# Altium footprint library ICs And Semiconductors SMD.PcbLib: 943 footprints (part 42 of 60)
Each footprint in its own frame and in the unit in brackets; x right, y up, seen from the top. Pads: shape width x height; smd on the part's side, far side on the other; paste and mask are expansions set on the pad; w line width, h text height; cw(c..) or ccw(c..) is an arc to the next point about the centre after c.
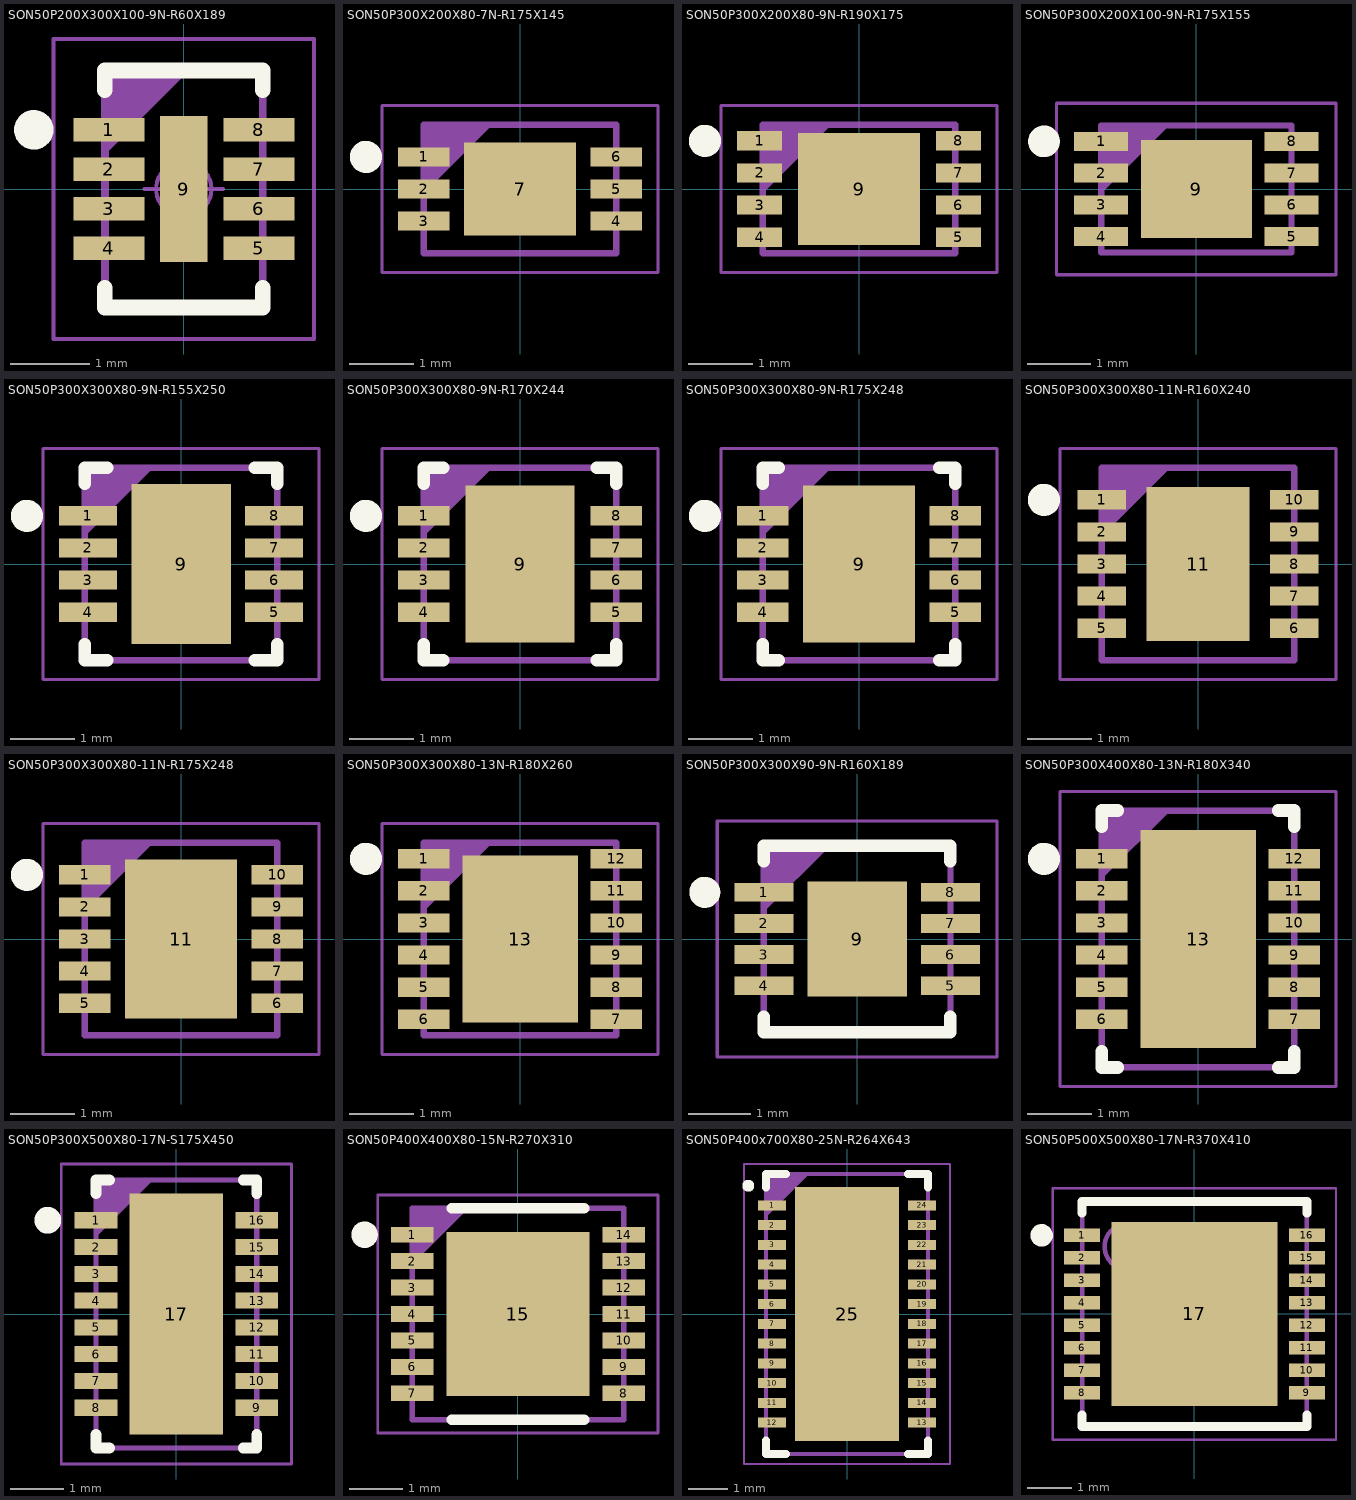
[diagram p41: the footprints below, top view; thin cyan lines are the x and y axes]

## SON50P200X300X100-9N-R60X189 [mm] "SON (DFN), 0.50mm pitch, 8 pin, 2mm X 3mm X 1mm H body (w/thermal tab 0.6 X 1.89mm),  IPC Medium Density"
height 1
pads (9):
  rect 0.9x0.3 smd: 1(-0.95,0.75) 2(-0.95,0.25) 3(-0.95,-0.25) 4(-0.95,-0.75) 5(0.95,-0.75) 6(0.95,-0.25) 7(0.95,0.25) 8(0.95,0.75)
  rect 0.6x1.85 smd paste-0.155: 9(0,0)
Top Overlay:
  circle w0.25: c-1.9,0.75 r0.125
  lines w0.2: -1,-1.25 -1,-1.5 1,-1.5 1,-1.25 ; -1,1.25 -1,1.5 1,1.5 1,1.25
Mechanical 14:
  lines w0.1: -1,0.5 0,1.5 ; -1,0.6 -0.1,1.5 ; -1,0.7 -0.2,1.5 ; -1,0.8 -0.3,1.5 ; -1,0.9 -0.4,1.5 ; -1,1 -0.5,1.5 ; -1,1.1 -0.6,1.5 ; -1,1.2 -0.7,1.5 ; -1,1.3 -0.8,1.5 ; -1,1.4 -0.9,1.5 ; -1,-1.5 -1,1.5 1,1.5 1,-1.5 -1,-1.5
Mechanical 15:
  circle w0.05: c0,0 r0.35
  lines w0.05: -0.5,0 0.5,0 ; 0,-0.5 0,0.5 ; -1.65,-1.9 -1.65,1.9 1.65,1.9 1.65,-1.9 -1.65,-1.9
3D body "SON50P200X300X100-9N-R60X189.stp": height 1, standoff 0, extent -1,-1.5 1,1.5

## SON50P300X200X80-7N-R175X145 [mm] "SON (DFN), 0.50mm pitch, 6 pin, 3mm X 2mm X 0.8mm H body (w/thermal tab 1.75 X 1.45mm),  IPC Medium Density"
height 0.8
pads (7):
  rect 0.8x0.3 smd: 1(-1.5,0.5) 2(-1.5,0) 3(-1.5,-0.5) 4(1.5,-0.5) 5(1.5,0) 6(1.5,0.5)
  rect 1.75x1.45 smd: 7(0,0)
Top Overlay:
  circle w0.25: c-2.4,0.5 r0.125
Mechanical 14:
  lines w0.1: -1.5,0 -0.5,1 ; -1.5,0.1 -0.6,1 ; -1.5,0.2 -0.7,1 ; -1.5,0.3 -0.8,1 ; -1.5,0.4 -0.9,1 ; -1.5,0.5 -1,1 ; -1.5,0.6 -1.1,1 ; -1.5,0.7 -1.2,1 ; -1.5,0.8 -1.3,1 ; -1.5,0.9 -1.4,1 ; -1.5,-1 1.5,-1 1.5,1 -1.5,1 -1.5,-1
Mechanical 15:
  circle w0.05: c0,0 r0.35
  lines w0.05: -0.5,0 0.5,0 ; 0,-0.5 0,0.5 ; -2.15,-1.3 2.15,-1.3 2.15,1.3 -2.15,1.3 -2.15,-1.3
3D body "SON50P300X200X80-7N-R175X145.stp": height 0.85, standoff 0, extent -1.55,-1.05 1.55,1.05

## SON50P300X200X80-9N-R190X175 [mm] "SON (DFN), 0.50mm pitch, 8 pin, 2mm X 3mm X 0.8mm H body (w/thermal tab 1.90 X 1.75mm),  IPC Medium Density"
height 0.8
pads (9):
  rect 0.7x0.3 smd: 1(-1.55,0.75) 2(-1.55,0.25) 3(-1.55,-0.25) 4(-1.55,-0.75) 5(1.55,-0.75) 6(1.55,-0.25) 7(1.55,0.25) 8(1.55,0.75)
  rect 1.9x1.75 smd: 9(0,0)
Top Overlay:
  circle w0.25: c-2.4,0.75 r0.125
Top Solder:
  circle w0.05: c0,0 r0.35
  lines w0.05: -0.5,0 0.5,0 ; 0,-0.5 0,0.5
Mechanical 14:
  lines w0.1: -1.5,0 -0.5,1 ; -1.5,0.1 -0.6,1 ; -1.5,0.2 -0.7,1 ; -1.5,0.3 -0.8,1 ; -1.5,0.4 -0.9,1 ; -1.5,0.5 -1,1 ; -1.5,0.6 -1.1,1 ; -1.5,0.7 -1.2,1 ; -1.5,0.8 -1.3,1 ; -1.5,0.9 -1.4,1 ; -1.5,-1 -1.5,1 1.5,1 1.5,-1 -1.5,-1
Mechanical 15:
  lines w0.05: -2.15,-1.3 -2.15,1.3 2.15,1.3 2.15,-1.3 -2.15,-1.3
3D body "SON50P300X200X80-9N-R190X175.stp": height 0.82, standoff 0, extent -1.5,-1 1.5,1

## SON50P300X200X100-9N-R175X155 [mm] "SON (DFN), 0.50mm pitch, 8 pin, 2mm X 3mm X 1.00mm H body (w/thermal tab 1.75 X 1.55mm),  IPC Medium Density"
height 1
pads (9):
  rect 0.85x0.3 smd: 1(-1.5,0.75) 2(-1.5,0.25) 3(-1.5,-0.25) 4(-1.5,-0.75) 5(1.5,-0.75) 6(1.5,-0.25) 7(1.5,0.25) 8(1.5,0.75)
  rect 1.75x1.55 smd: 9(0,0)
Top Overlay:
  circle w0.25: c-2.4,0.75 r0.125
Mechanical 14:
  lines w0.1: -1.5,0 -0.5,1 ; -1.5,0.1 -0.6,1 ; -1.5,0.2 -0.7,1 ; -1.5,0.3 -0.8,1 ; -1.5,0.4 -0.9,1 ; -1.5,0.5 -1,1 ; -1.5,0.6 -1.1,1 ; -1.5,0.7 -1.2,1 ; -1.5,0.8 -1.3,1 ; -1.5,0.9 -1.4,1 ; -1.5,-1 -1.5,1 1.5,1 1.5,-1 -1.5,-1
Mechanical 15:
  lines w0.05: -2.2,-1.35 -2.2,1.35 2.2,1.35 2.2,-1.35 -2.2,-1.35
3D body "SON50P300X200X100-9N-R175X155.stp": height 1.02, standoff 0, extent -1.5,-1 1.5,1

## SON50P300X300X80-9N-R155X250 [mm] "SON,  0.50mm Pitch, 8 Pin, 3mm X 3mm X 0.8mm H Body (w/Thermal Tab 1.55 X 2.5mm),  IPC Medium Density"
height 0.8
pads (9):
  rect 0.9x0.3 smd: 1(-1.45,0.75) 2(-1.45,0.25) 3(-1.45,-0.25) 4(-1.45,-0.75) 5(1.45,-0.75) 6(1.45,-0.25) 7(1.45,0.25) 8(1.45,0.75)
  rect 1.55x2.5 smd paste-0.345: 9(0,0)
Top Overlay:
  circle w0.25: c-2.4,0.75 r0.125
  lines w0.2: -1.5,-1.25 -1.5,-1.5 -1.15,-1.5 ; -1.5,1.25 -1.5,1.5 -1.15,1.5 ; 1.15,-1.5 1.5,-1.5 1.5,-1.25 ; 1.15,1.5 1.5,1.5 1.5,1.25
Mechanical 14:
  lines w0.1: -1.5,0.5 -0.5,1.5 ; -1.5,0.6 -0.6,1.5 ; -1.5,0.7 -0.7,1.5 ; -1.5,0.8 -0.8,1.5 ; -1.5,0.9 -0.9,1.5 ; -1.5,1 -1,1.5 ; -1.5,1.1 -1.1,1.5 ; -1.5,1.2 -1.2,1.5 ; -1.5,1.3 -1.3,1.5 ; -1.5,1.4 -1.4,1.5 ; -1.5,-1.5 1.5,-1.5 1.5,1.5 -1.5,1.5 -1.5,-1.5
Mechanical 15:
  circle w0.05: c0,0 r0.35
  lines w0.05: -0.5,0 0.5,0 ; 0,-0.5 0,0.5 ; -2.15,-1.8 -2.15,1.8 2.15,1.8 2.15,-1.8 -2.15,-1.8
3D body "SON50P300X300X80-9N-R155X250.stp": height 0.8, standoff 0, extent -1.5,-1.5 1.5,1.5

## SON50P300X300X80-9N-R170X244 [mm] "SON, (DFN) 0.50mm,pitch; 8 pin,3.00mm W X 3.00mm L X 0.80mm H body (w/thermal tab 1.7 X2.44mm), IPC Medium Density"
height 0.8
pads (9):
  rect 0.8x0.3 smd: 1(-1.5,0.75) 2(-1.5,0.25) 3(-1.5,-0.25) 4(-1.5,-0.75) 5(1.5,-0.75) 6(1.5,-0.25) 7(1.5,0.25) 8(1.5,0.75)
  rect 1.7x2.44 smd: 9(0,0)
Top Overlay:
  circle w0.25: c-2.4,0.75 r0.125
  lines w0.2: -1.5,-1.25 -1.5,-1.5 -1.2,-1.5 ; -1.5,1.25 -1.5,1.5 -1.2,1.5 ; 1.2,-1.5 1.5,-1.5 1.5,-1.25 ; 1.2,1.5 1.5,1.5 1.5,1.25
Mechanical 14:
  circle w0.05: c0,0 r0.35
  lines w0.05: -0.5,0 0.5,0 ; 0,-0.5 0,0.5
  lines w0.1: -1.5,0.5 -0.5,1.5 ; -1.5,0.6 -0.6,1.5 ; -1.5,0.7 -0.7,1.5 ; -1.5,0.8 -0.8,1.5 ; -1.5,0.9 -0.9,1.5 ; -1.5,1 -1,1.5 ; -1.5,1.1 -1.1,1.5 ; -1.5,1.2 -1.2,1.5 ; -1.5,1.3 -1.3,1.5 ; -1.5,1.4 -1.4,1.5 ; -1.5,-1.5 -1.5,1.5 1.5,1.5 1.5,-1.5 -1.5,-1.5
Mechanical 15:
  lines w0.05: -2.15,-1.8 2.15,-1.8 2.15,1.8 -2.15,1.8 -2.15,-1.8
3D body "SON50P300X300X80-9N-R170X244.stp": height 0.8, standoff 0, extent -1.55,-1.55 1.55,1.55

## SON50P300X300X80-9N-R175X248 [mm] "SON, (DFN) 0.50mm,pitch; 8 pin,3.00mm W X 3.00mm L X 0.80mm H body (w/thermal tab 1.75 X2.48mm), IPC Medium Density"
height 0.8
pads (9):
  rect 0.8x0.3 smd: 1(-1.5,0.75) 2(-1.5,0.25) 3(-1.5,-0.25) 4(-1.5,-0.75) 5(1.5,-0.75) 6(1.5,-0.25) 7(1.5,0.25) 8(1.5,0.75)
  rect 1.75x2.45 smd: 9(0,0)
Top Overlay:
  circle w0.25: c-2.4,0.75 r0.125
  lines w0.2: -1.5,-1.25 -1.5,-1.5 -1.25,-1.5 ; -1.5,1.25 -1.5,1.5 -1.25,1.5 ; 1.25,-1.5 1.5,-1.5 1.5,-1.25 ; 1.25,1.5 1.5,1.5 1.5,1.25
Mechanical 14:
  lines w0.1: -1.5,0.5 -0.5,1.5 ; -1.5,0.6 -0.6,1.5 ; -1.5,0.7 -0.7,1.5 ; -1.5,0.8 -0.8,1.5 ; -1.5,0.9 -0.9,1.5 ; -1.5,1 -1,1.5 ; -1.5,1.1 -1.1,1.5 ; -1.5,1.2 -1.2,1.5 ; -1.5,1.3 -1.3,1.5 ; -1.5,1.4 -1.4,1.5 ; -1.5,-1.5 -1.5,1.5 1.5,1.5 1.5,-1.5 -1.5,-1.5
Mechanical 15:
  lines w0.05: -0.5,0 0.5,0 ; 0,-0.5 0,0.5 ; -2.15,-1.8 2.15,-1.8 2.15,1.8 -2.15,1.8 -2.15,-1.8
3D body "SON50P300X300X80-9N-R175X248.stp": height 0.8, standoff 0, extent -1.55,-1.55 1.55,1.55

## SON50P300X300X80-11N-R160X240 [mm] "SON, 0.50mm Pitch, 10-pin, 3.00mm W  X 3.00mm L X 0.80mm Height, (w/thermal tab 1.60 X 2.40 mm), IPC Medium Density"
height 0.8
pads (11):
  rect 0.75x0.3 smd: 1(-1.5,1) 2(-1.5,0.5) 3(-1.5,0) 4(-1.5,-0.5) 5(-1.5,-1) 6(1.5,-1) 7(1.5,-0.5) 8(1.5,0) 9(1.5,0.5) 10(1.5,1)
  rect 1.6x2.4 smd paste-0.35: 11(0,0)
Top Overlay:
  circle w0.25: c-2.4,1 r0.125
Mechanical 14:
  lines w0.1: -1.5,0.5 -0.5,1.5 ; -1.5,0.6 -0.6,1.5 ; -1.5,0.7 -0.7,1.5 ; -1.5,0.8 -0.8,1.5 ; -1.5,0.9 -0.9,1.5 ; -1.5,1 -1,1.5 ; -1.5,1.1 -1.1,1.5 ; -1.5,1.2 -1.2,1.5 ; -1.5,1.3 -1.3,1.5 ; -1.5,1.4 -1.4,1.5 ; -1.5,-1.5 1.5,-1.5 1.5,1.5 -1.5,1.5 -1.5,-1.5
Mechanical 15:
  circle w0.05: c0,0 r0.35
  lines w0.05: -0.5,0 0.5,0 ; 0,-0.5 0,0.5 ; -2.15,-1.8 -2.15,1.8 2.15,1.8 2.15,-1.8 -2.15,-1.8
3D body "SON50P300X300X80-11N-R160X240.stp": height 0.8, standoff 0, extent -1.5,-1.5 1.5,1.5

## SON50P300X300X80-11N-R175X248 [mm] "SON, 0.50mm Pitch, 10-pin, 3.00mm W  X 3.00mm L X 0.80mm Height, (w/thermal tab 1.75 X 2.48 mm), IPC Medium Density"
height 0.8
pads (11):
  rect 0.8x0.3 smd: 1(-1.5,1) 2(-1.5,0.5) 3(-1.5,0) 4(-1.5,-0.5) 5(-1.5,-1) 6(1.5,-1) 7(1.5,-0.5) 8(1.5,0) 9(1.5,0.5) 10(1.5,1)
  rect 1.75x2.48 smd: 11(0,0)
Top Overlay:
  circle w0.25: c-2.4,1 r0.125
Mechanical 14:
  lines w0.1: -1.5,0.5 -0.5,1.5 ; -1.5,0.6 -0.6,1.5 ; -1.5,0.7 -0.7,1.5 ; -1.5,0.8 -0.8,1.5 ; -1.5,0.9 -0.9,1.5 ; -1.5,1 -1,1.5 ; -1.5,1.1 -1.1,1.5 ; -1.5,1.2 -1.2,1.5 ; -1.5,1.3 -1.3,1.5 ; -1.5,1.4 -1.4,1.5 ; -1.5,-1.5 1.5,-1.5 1.5,1.5 -1.5,1.5 -1.5,-1.5
Mechanical 15:
  circle w0.05: c0,0 r0.35
  lines w0.05: -0.5,0 0.5,0 ; 0,-0.5 0,0.5 ; -2.15,-1.8 -2.15,1.8 2.15,1.8 2.15,-1.8 -2.15,-1.8
3D body "SON50P300X300X80-11N-R175X248.stp": height 0.8, standoff 0, extent -1.5,-1.5 1.5,1.5

## SON50P300X300X80-13N-R180X260 [mm] "SON, 0.50mm Pitch, 12-Pin, 3.00mm W  X 3.00mm L X 0.80mm Height, (w/Thermal Tab 1.8 X 2.6 mm), IPC Medium Density"
height 0.8
pads (13):
  rect 0.8x0.3 smd: 1(-1.5,1.25) 2(-1.5,0.75) 3(-1.5,0.25) 4(-1.5,-0.25) 5(-1.5,-0.75) 6(-1.5,-1.25) 7(1.5,-1.25) 8(1.5,-0.75) 9(1.5,-0.25) 10(1.5,0.25) 11(1.5,0.75) 12(1.5,1.25)
  rect 1.8x2.6 smd: 13(0,0)
Top Overlay:
  circle w0.25: c-2.4,1.25 r0.125
Mechanical 14:
  lines w0.1: -1.5,0.5 -0.5,1.5 ; -1.5,0.6 -0.6,1.5 ; -1.5,0.7 -0.7,1.5 ; -1.5,0.8 -0.8,1.5 ; -1.5,0.9 -0.9,1.5 ; -1.5,1 -1,1.5 ; -1.5,1.1 -1.1,1.5 ; -1.5,1.2 -1.2,1.5 ; -1.5,1.3 -1.3,1.5 ; -1.5,1.4 -1.4,1.5 ; -1.5,-1.5 -1.5,1.5 1.5,1.5 1.5,-1.5 -1.5,-1.5
Mechanical 15:
  circle w0.05: c0,0 r0.35
  lines w0.05: -0.5,0 0.5,0 ; 0,-0.5 0,0.5 ; -2.15,-1.8 2.15,-1.8 2.15,1.8 -2.15,1.8 -2.15,-1.8
3D body "SON50P300X300X80-13N-R180X260.stp": height 0.8, standoff 0, extent -1.55,-1.55 1.55,1.55

## SON50P300X300X90-9N-R160X189 [mm] "SON (DFN), 0.50mm pitch, 8 pin, 3mm X 3mm X 0.9mm H body (w/thermal tab 1.6 X 1.89mm),  IPC Medium Density"
height 0.9
pads (9):
  rect 0.95x0.3 smd: 1(-1.5,0.75) 2(-1.5,0.25) 3(-1.5,-0.25) 4(-1.5,-0.75) 5(1.5,-0.75) 6(1.5,-0.25) 7(1.5,0.25) 8(1.5,0.75)
  rect 1.6x1.85 smd: 9(0,0)
Top Overlay:
  circle w0.25: c-2.45,0.75 r0.125
  lines w0.2: -1.5,-1.25 -1.5,-1.5 1.5,-1.5 1.5,-1.25 ; -1.5,1.25 -1.5,1.5 1.5,1.5 1.5,1.25
Mechanical 14:
  lines w0.1: -1.5,0.5 -0.5,1.5 ; -1.5,0.6 -0.6,1.5 ; -1.5,0.7 -0.7,1.5 ; -1.5,0.8 -0.8,1.5 ; -1.5,0.9 -0.9,1.5 ; -1.5,1 -1,1.5 ; -1.5,1.1 -1.1,1.5 ; -1.5,1.2 -1.2,1.5 ; -1.5,1.3 -1.3,1.5 ; -1.5,1.4 -1.4,1.5 ; -1.5,-1.5 1.5,-1.5 1.5,1.5 -1.5,1.5 -1.5,-1.5
Mechanical 15:
  lines w0.05: -0.5,0 0.5,0 ; 0,-0.5 0,0.5 ; -2.25,-1.9 -2.25,1.9 2.25,1.9 2.25,-1.9 -2.25,-1.9
3D body "SON50P300X300X90-9N-R160X189.stp": height 0.9, standoff 0, extent -1.625,-1.625 1.625,1.625

## SON50P300X400X80-13N-R180X340 [mm] "SON, (DFN) 0.50mm,pitch;12 pin,3.00mm W X 4.00mm L X 0.80mm H body (w/thermal tab 1.8 X3.4mm), IPC Medium Density"
height 0.8
pads (13):
  rect 0.8x0.3 smd: 1(-1.5,1.25) 2(-1.5,0.75) 3(-1.5,0.25) 4(-1.5,-0.25) 5(-1.5,-0.75) 6(-1.5,-1.25) 7(1.5,-1.25) 8(1.5,-0.75) 9(1.5,-0.25) 10(1.5,0.25) 11(1.5,0.75) 12(1.5,1.25)
  rect 1.8x3.4 smd: 13(0,0)
Top Overlay:
  circle w0.25: c-2.4,1.25 r0.125
  lines w0.2: -1.5,-1.75 -1.5,-2 -1.25,-2 ; -1.5,1.75 -1.5,2 -1.25,2 ; 1.25,-2 1.5,-2 1.5,-1.75 ; 1.25,2 1.5,2 1.5,1.75
Mechanical 14:
  lines w0.1: -1.5,1 -0.5,2 ; -1.5,1.1 -0.6,2 ; -1.5,1.2 -0.7,2 ; -1.5,1.3 -0.8,2 ; -1.5,1.4 -0.9,2 ; -1.5,1.5 -1,2 ; -1.5,1.6 -1.1,2 ; -1.5,1.7 -1.2,2 ; -1.5,1.8 -1.3,2 ; -1.5,1.9 -1.4,2 ; -1.5,-2 1.5,-2 1.5,2 -1.5,2 -1.5,-2
Mechanical 15:
  lines w0.05: -0.5,0 0.5,0 ; 0,-0.5 0,0.5 ; -2.15,-2.3 2.15,-2.3 2.15,2.3 -2.15,2.3 -2.15,-2.3
3D body "SON50P300X400X80-13N-R180X340.stp": height 0.8, standoff 0, extent -1.55,-2.05 1.55,2.05

## SON50P300X500X80-17N-S175X450 [mm] "SON, 0.50mm Pitch; 16 Pin, 3.00mm W X 5.00mm L X 0.80mm H Body (w/thermal tab 1.75 X4.5mm), IPC Medium Density"
height 0.8
pads (17):
  rect 0.8x0.3 smd: 1(-1.5,1.75) 2(-1.5,1.25) 3(-1.5,0.75) 4(-1.5,0.25) 5(-1.5,-0.25) 6(-1.5,-0.75) 7(-1.5,-1.25) 8(-1.5,-1.75) 9(1.5,-1.75) 10(1.5,-1.25) 11(1.5,-0.75) 12(1.5,-0.25) 13(1.5,0.25) 14(1.5,0.75) 15(1.5,1.25) 16(1.5,1.75)
  rect 1.75x4.5 smd: 17(0,0)
Top Overlay:
  circle w0.25: c-2.4,1.75 r0.125
  lines w0.2: -1.5,-2.25 -1.5,-2.5 -1.25,-2.5 ; -1.5,2.25 -1.5,2.5 -1.25,2.5 ; 1.25,-2.5 1.5,-2.5 1.5,-2.25 ; 1.25,2.5 1.5,2.5 1.5,2.25
Mechanical 14:
  lines w0.1: -1.5,1.5 -0.5,2.5 ; -1.5,1.6 -0.6,2.5 ; -1.5,1.7 -0.7,2.5 ; -1.5,1.8 -0.8,2.5 ; -1.5,1.9 -0.9,2.5 ; -1.5,2 -1,2.5 ; -1.5,2.1 -1.1,2.5 ; -1.5,2.2 -1.2,2.5 ; -1.5,2.3 -1.3,2.5 ; -1.5,2.4 -1.4,2.5 ; -1.5,-2.5 -1.5,2.5 1.5,2.5 1.5,-2.5 -1.5,-2.5
Mechanical 15:
  circle w0.05: c0,0 r0.35
  lines w0.05: -0.5,0 0.5,0 ; 0,-0.5 0,0.5 ; -2.15,-2.8 -2.15,2.8 2.15,2.8 2.15,-2.8 -2.15,-2.8
3D body "SON50P300X500X80-17N-S175X450.stp": height 0.8, standoff 0, extent -1.5,-2.5 1.5,2.5

## SON50P400X400X80-15N-R270X310 [mm] "SON, 0.50mm Pitch; 14 Pin 4.00mm W X 4.00mm L X 0.080mm H body (w/thermal tab 2.7 X 3.1 mm), IPC Medium Density"
height 0.8
pads (15):
  rect 0.8x0.3 smd: 1(-2,1.5) 2(-2,1) 3(-2,0.5) 4(-2,0) 5(-2,-0.5) 6(-2,-1) 7(-2,-1.5) 8(2,-1.5) 9(2,-1) 10(2,-0.5) 11(2,0) 12(2,0.5) 13(2,1) 14(2,1.5)
  rect 2.7x3.1 smd paste-0.53: 15(0,0)
Top Overlay:
  circle w0.25: c-2.9,1.5 r0.125
  lines w0.2: -1.25,-2 1.25,-2 ; -1.25,2 1.25,2
Mechanical 14:
  lines w0.1: -2,1 -1,2 ; -2,1.1 -1.1,2 ; -2,1.2 -1.2,2 ; -2,1.3 -1.3,2 ; -2,1.4 -1.4,2 ; -2,1.5 -1.5,2 ; -2,1.6 -1.6,2 ; -2,1.7 -1.7,2 ; -2,1.8 -1.8,2 ; -2,1.9 -1.9,2 ; -2,-2 -2,2 2,2 2,-2 -2,-2
Mechanical 15:
  circle w0.05: c0,0 r0.35
  lines w0.05: -0.5,0 0.5,0 ; 0,-0.5 0,0.5 ; -2.65,-2.25 2.65,-2.25 2.65,2.25 -2.65,2.25 -2.65,-2.25
3D body "SON50P400X400X80-15N-R270X310.stp": height 0.8, standoff 0, extent -2.05,-2.05 2.05,2.05

## SON50P400x700X80-25N-R264X643 [mm] "SON, 24-Leads, Body 7x4mm, Pitch 0.50mm, Thermal Pad 6.43x2.64mm, IPC Medium Density"
height 0.8
pads (25):
  rect 0.7x0.25 smd: 1(-1.9,2.75) 2(-1.9,2.25) 3(-1.9,1.75) 4(-1.9,1.25) 5(-1.9,0.75) 6(-1.9,0.25) 7(-1.9,-0.25) 8(-1.9,-0.75) 9(-1.9,-1.25) 10(-1.9,-1.75) 11(-1.9,-2.25) 12(-1.9,-2.75) 13(1.9,-2.75) 14(1.9,-2.25) 15(1.9,-1.75) 16(1.9,-1.25) 17(1.9,-0.75) 18(1.9,-0.25) 19(1.9,0.25) 20(1.9,0.75) 21(1.9,1.25) 22(1.9,1.75) 23(1.9,2.25) 24(1.9,2.75)
  rect 2.64x6.43 smd: 25(0,0)
Top Overlay:
  circle w0.2: c-2.5,3.25 r0.05
  lines w0.2: -2.05,-3.2 -2.05,-3.55 -1.55,-3.55 ; -2.05,3.2 -2.05,3.55 -1.55,3.55 ; 1.55,-3.55 2.05,-3.55 2.05,-3.2 ; 1.55,3.55 2.05,3.55 2.05,3.2
Mechanical 14:
  lines w0.1: -2.025,2.55 -1.025,3.55 ; -2.025,2.65 -1.125,3.55 ; -2.025,2.75 -1.225,3.55 ; -2.025,2.85 -1.325,3.55 ; -2.025,2.95 -1.425,3.55 ; -2.025,3.05 -1.525,3.55 ; -2.025,3.15 -1.625,3.55 ; -2.025,3.25 -1.725,3.55 ; -2.025,3.35 -1.825,3.55 ; -2.025,3.45 -1.925,3.55 ; -2.05,-3.55 -2.05,3.55 2.05,3.55 2.05,-3.55 -2.05,-3.55
Mechanical 15:
  lines w0.05: -0.5,0 0.5,0 ; 0,-0.5 0,0.5 ; -2.605,-3.8 -2.605,3.8 2.605,3.8 2.605,-3.8 -2.605,-3.8
3D body "SON50P400X700X80-25N-R264X643.stp": height 0.8, standoff 0, extent -2.05,-3.55 2.05,3.55

## SON50P500X500X80-17N-R370X410 [mm] "SON, 0.50mm Pitch; 16 Pin, 5.00mm W X 5.00mm L X 0.80mm H body (w/thermal tab 3.70 X 4.10 mm), IPC Medium Density"
height 0.8
pads (17):
  rect 0.8x0.3 smd: 1(-2.5,1.75) 2(-2.5,1.25) 3(-2.5,0.75) 4(-2.5,0.25) 5(-2.5,-0.25) 6(-2.5,-0.75) 7(-2.5,-1.25) 8(-2.5,-1.75) 9(2.5,-1.75) 10(2.5,-1.25) 11(2.5,-0.75) 12(2.5,-0.25) 13(2.5,0.25) 14(2.5,0.75) 15(2.5,1.25) 16(2.5,1.75)
  rect 3.7x4.1 smd paste-0.715: 17(0,0)
Top Overlay:
  circle w0.25: c-3.4,1.75 r0.125
  lines w0.2: -2.5,-2.25 -2.5,-2.5 2.5,-2.5 2.5,-2.25 ; -2.5,2.25 -2.5,2.5 2.5,2.5 2.5,2.25
Mechanical 14:
  circle w0.1: c-1.5,1.5 r0.5
  lines w0.1: -2.5,-2.5 2.5,-2.5 2.5,2.5 -2.5,2.5 -2.5,-2.5
Mechanical 15:
  circle w0.05: c0,0 r0.35
  lines w0.05: -0.5,0 0.5,0 ; 0,-0.5 0,0.5 ; -3.15,-2.8 -3.15,2.8 3.15,2.8 3.15,-2.8 -3.15,-2.8
3D body "SON50P500X500X80-17N-R370X410.stp": height 0.8, standoff 0, extent -2.55,-2.55 2.55,2.55